# Altium footprint library PcbLib1.PcbLib: 70 footprints (part 5 of 5)
Each footprint in its own frame and in the unit in brackets; x right, y up, seen from the top. Pads: shape width x height; smd on the part's side, far side on the other; paste and mask are expansions set on the pad; w line width, h text height; cw(c..) or ccw(c..) is an arc to the next point about the centre after c.
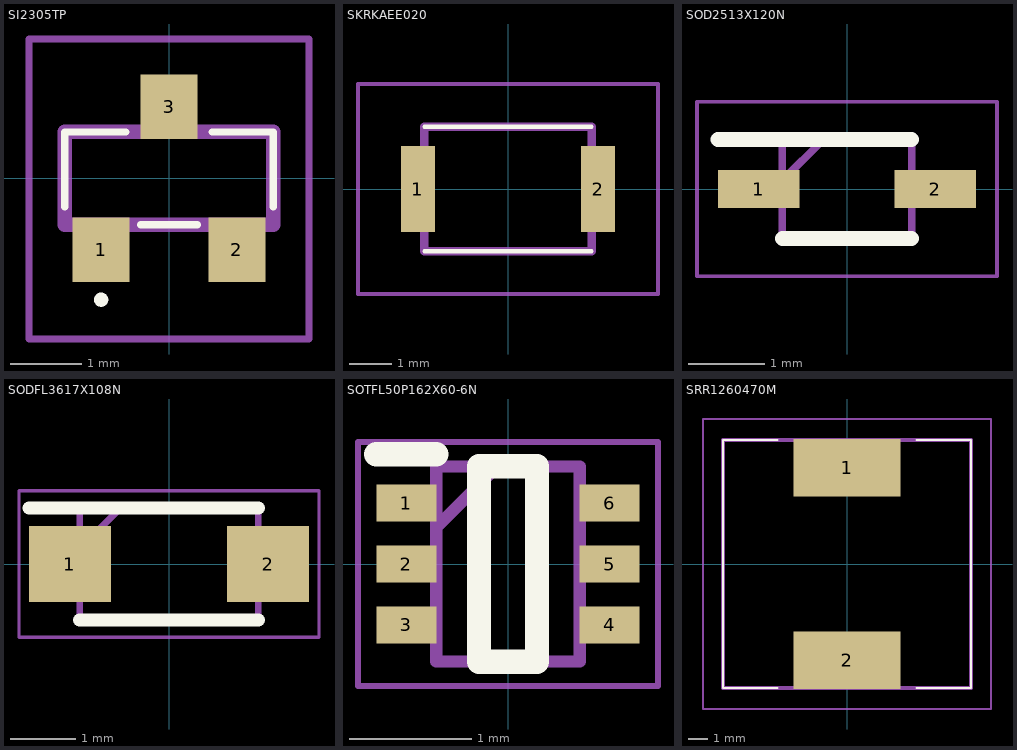
[diagram p4: the footprints below, top view; thin cyan lines are the x and y axes]

## SI2305TP [mm]
pads (3):
  rect 0.8x0.9 smd: 1(-0.95,-1) 2(0.95,-1) 3(0,1)
Top Overlay:
  lines w0.1: -1.46,-0.4 -1.46,0.65 -0.6,0.65 ; -0.4,-0.65 0.4,-0.65 ; 0.6,0.65 1.46,0.65 1.46,-0.4 ; -1,-1.7 ccw(c-0.95,-1.7) -0.9,-1.7 ccw(c-0.95,-1.7) -1,-1.7
Mechanical 13:
  lines w0.2: -1.46,-0.65 -1.46,0.65 1.46,0.65 1.46,-0.65 -1.46,-0.65
Mechanical 15:
  lines w0.1: -1.96,-2.25 -1.96,1.95 1.96,1.95 1.96,-2.25 -1.96,-2.25
3D body "MMSS8050-H-TP.stp": height 0.89, standoff -0.01, extent -1.4,-1.05 1.4,1.05

## SKRKAEE020 [mm]
pads (2):
  rect 0.8x2 smd: 1(-2.1,0) 2(2.1,0)
Top Overlay:
  lines w0.1: -1.95,-1.45 1.95,-1.45 ; -1.95,1.45 1.95,1.45
Mechanical 13:
  lines w0.2: -1.95,-1.45 1.95,-1.45 1.95,1.45 -1.95,1.45 -1.95,-1.45
Mechanical 15:
  lines w0.1: -3.5,-2.45 3.5,-2.45 3.5,2.45 -3.5,2.45 -3.5,-2.45
3D body "SKRKAHE020.stp": height 2, standoff 0, extent -2.4,-1.45 2.4,1.45

## SOD2513X120N [mm]
pads (2):
  rect 1.075x0.5 smd: 1(-1.162,0) 2(1.162,0)
Top Overlay:
  lines w0.2: -1.7,0.65 0.85,0.65 ; -0.85,-0.65 0.85,-0.65
Mechanical 13:
  lines w0.1: -0.85,0.112 -0.312,0.65 ; -0.85,-0.65 0.85,-0.65 0.85,0.65 -0.85,0.65 -0.85,-0.65
Mechanical 15:
  lines w0.05: -1.975,-1.15 1.975,-1.15 1.975,1.15 -1.975,1.15 -1.975,-1.15
3D body "BAT760-7.stp": height 1.2, standoff 0, extent -1.25,-0.65 1.25,0.65

## SODFL3617X108N [mm]
pads (2):
  rect 1.26x1.17 smd: 1(-1.525,0) 2(1.525,0)
Top Overlay:
  lines w0.2: -2.155,0.862 1.375,0.862 ; -1.375,-0.862 1.375,-0.862
Mechanical 13:
  lines w0.1: -1.375,0.232 -0.745,0.862 ; -1.375,-0.862 -1.375,0.862 1.375,0.862 1.375,-0.862 -1.375,-0.862
Mechanical 15:
  lines w0.05: -2.305,-1.125 -2.305,1.125 2.305,1.125 2.305,-1.125 -2.305,-1.125
3D body "SS26FL.stp": height 1.08, standoff 0, extent -1.8,-0.863 1.8,0.863

## SOTFL50P162X60-6N [mm]
pads (6):
  rect 0.492x0.3 smd: 1(-0.834,0.5) 2(-0.834,0) 3(-0.834,-0.5) 4(0.834,-0.5) 5(0.834,0) 6(0.834,0.5)
Top Overlay:
  lines w0.2: -1.08,0.9 -0.588,0.9 ; -0.238,-0.8 0.238,-0.8 0.238,0.8 -0.238,0.8 -0.238,-0.8
Mechanical 13:
  lines w0.1: -0.588,0.3 -0.088,0.8 ; -0.588,-0.8 0.588,-0.8 0.588,0.8 -0.588,0.8 -0.588,-0.8
Mechanical 15:
  lines w0.05: -1.23,-1 1.23,-1 1.23,1 -1.23,1 -1.23,-1
3D body "RCLAMP0502A.TCT.stp": height 0.6, standoff 0, extent -0.813,-0.8 0.813,0.8

## SRR1260470M [mm]
pads (2):
  rect 5.4x2.9 smd: 1(0,4.85) 2(0,-4.85)
Top Overlay:
  lines w0.1: -3.5,-6.25 -6.25,-6.25 -6.25,6.25 -3.5,6.25 ; 3.5,-6.25 6.25,-6.25 6.25,6.25 3.5,6.25
Mechanical 13:
  lines w0.2: -6.25,-6.25 -6.25,6.25 6.25,6.25 6.25,-6.25 -6.25,-6.25
Mechanical 15:
  lines w0.1: -7.25,-7.3 -7.25,7.3 7.25,7.3 7.25,-7.3 -7.25,-7.3
3D body "SRR1260-470M.stp": height 6, standoff 0, extent -6.25,-6.25 6.25,6.25